# Altium schematic symbol library MCU_Microchip_ATmega.SchLib: 440 symbols (part 4 of 7) (continued)
## ATmega1284P-P (continued)
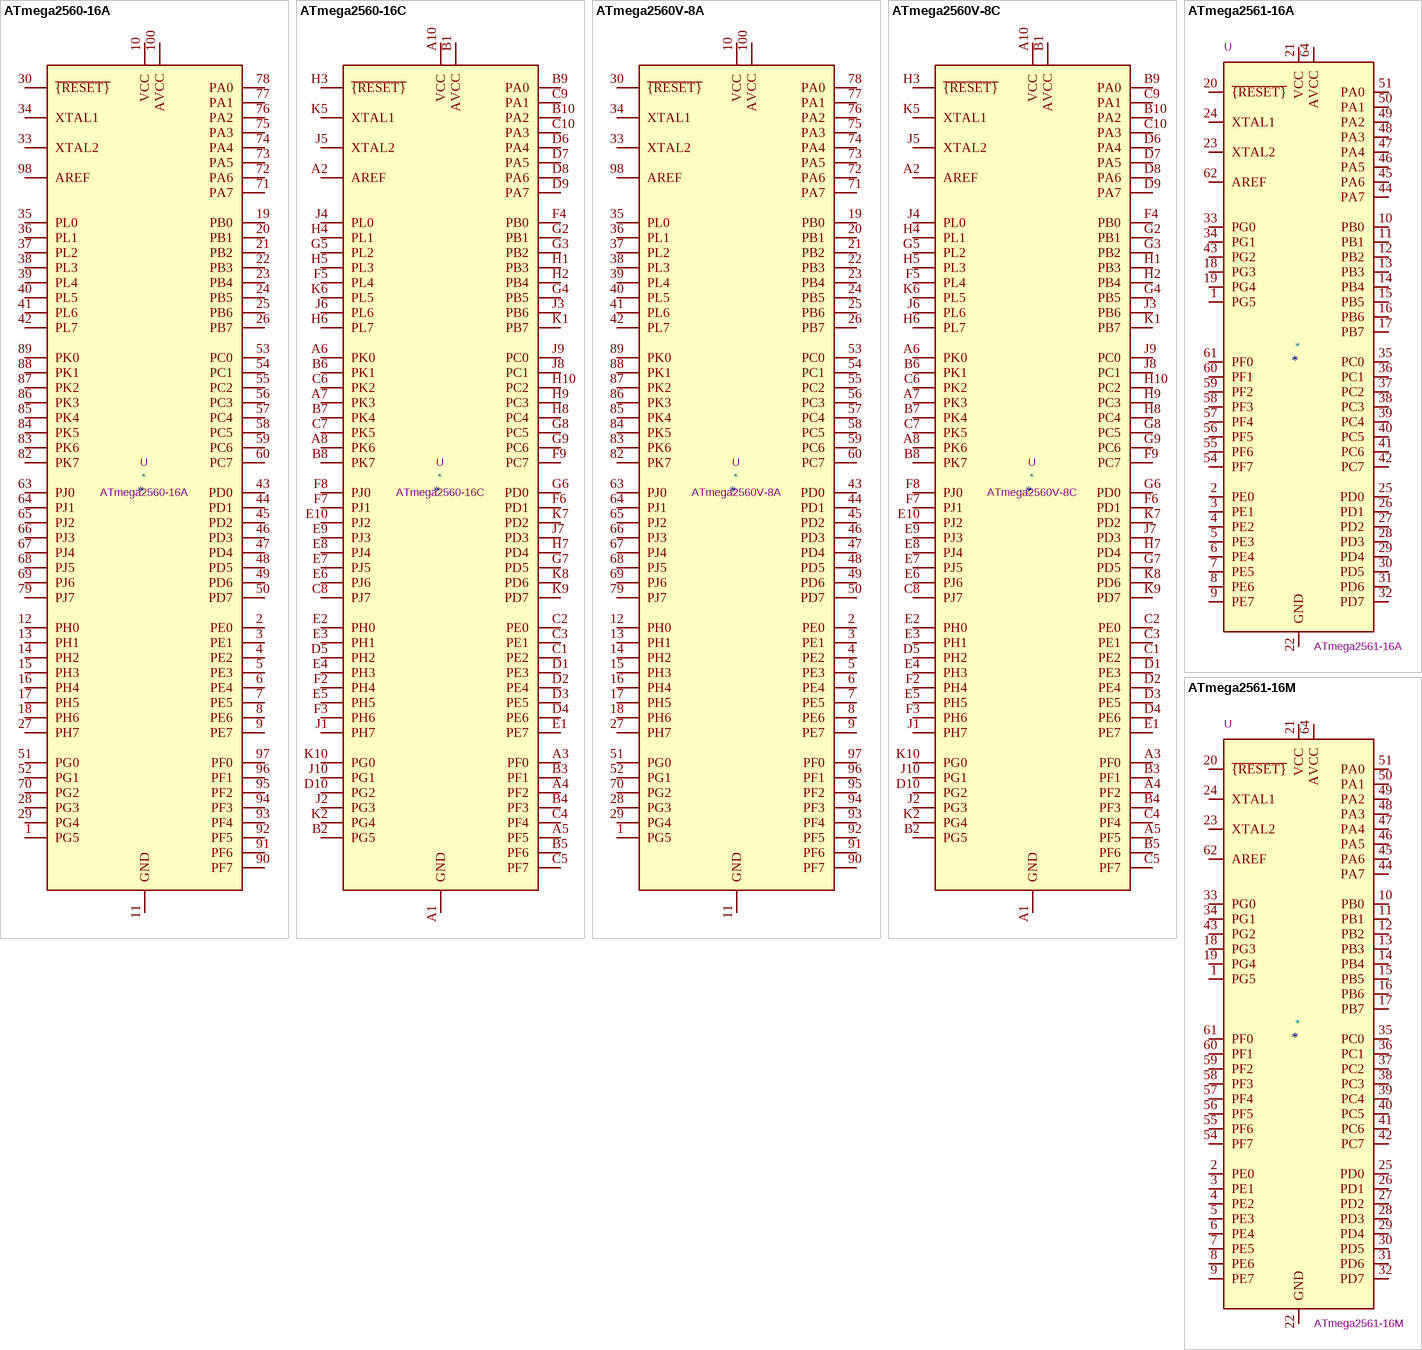
[diagram p24: symbols ATmega2560-16A to ATmega2561-16M]

## ATmega2560-16A
designator *  value ATmega2560-16A  Reference: U
ki_keywords: AVR 8bit Microcontroller MegaAVR; ki_description: 16MHz, 256kB Flash, 8kB SRAM, 4kB EEPROM, JTAG, TQFP-100; ki_fp_filters: TQFP*14x14mm*P0.5mm*; Footprint: Package_QFP:TQFP-100_14x14mm_P0.5mm; Datasheet: http://ww1.microchip.com/downloads/en/DeviceDoc/Atmel-2549-8-bit-AVR-Microcontroller-ATmega640-1280-1281-2560-2561_datasheet.pdf
pins: 1 PG5, 2 PE0, 3 PE1, 4 PE2, 5 PE3, 6 PE4, 7 PE5, 8 PE6, 9 PE7, 10 VCC, 11 GND, 12 PH0, 13 PH1, 14 PH2, 15 PH3, 16 PH4, 17 PH5, 18 PH6, 19 PB0, 20 PB1, 21 PB2, 22 PB3, 23 PB4, 24 PB5, 25 PB6, 26 PB7, 27 PH7, 28 PG3, 29 PG4, 30 ~{{RESET}}, 31 VCC hidden, 32 GND hidden, 33 XTAL2, 34 XTAL1, 35 PL0, 36 PL1, 37 PL2, 38 PL3, 39 PL4, 40 PL5, 41 PL6, 42 PL7, 43 PD0, 44 PD1, 45 PD2, 46 PD3, 47 PD4, 48 PD5, 49 PD6, 50 PD7, 51 PG0, 52 PG1, 53 PC0, 54 PC1, 55 PC2, 56 PC3, 57 PC4, 58 PC5, 59 PC6, 60 PC7, 61 VCC hidden, 62 GND hidden, 63 PJ0, 64 PJ1, 65 PJ2, 66 PJ3, 67 PJ4, 68 PJ5, 69 PJ6, 70 PG2, 71 PA7, 72 PA6, 73 PA5, 74 PA4, 75 PA3, 76 PA2, 77 PA1, 78 PA0, 79 PJ7, 80 VCC hidden, 81 GND hidden, 82 PK7, 83 PK6, 84 PK5, 85 PK4, 86 PK3, 87 PK2, 88 PK1, 89 PK0, 90 PF7, 91 PF6, 92 PF5, 93 PF4, 94 PF3, 95 PF2, 96 PF1, 97 PF0, 98 AREF, 99 GND hidden, 100 AVCC

## ATmega2560-16C
designator *  value ATmega2560-16C  Reference: U
ki_keywords: AVR 8bit Microcontroller MegaAVR; ki_description: 16MHz, 256kB Flash, 8kB SRAM, 4kB EEPROM, JTAG, TFBGA-100; ki_fp_filters: TFBGA*9.0x9.0mm*Layout10x10*P0.8mm*; Footprint: Package_BGA:TFBGA-100_9.0x9.0mm_Layout10x10_P0.8mm; Datasheet: http://ww1.microchip.com/downloads/en/DeviceDoc/Atmel-2549-8-bit-AVR-Microcontroller-ATmega640-1280-1281-2560-2561_datasheet.pdf
pins: A1 GND, A2 AREF, A3 PF0, A4 PF2, A5 PF5, A6 PK0, A7 PK3, A8 PK6, A9 GND hidden, A10 VCC, B1 AVCC, B2 PG5, B3 PF1, B4 PF3, B5 PF6, B6 PK1, B7 PK4, B8 PK7, B9 PA0, B10 PA2, C1 PE2, C2 PE0, C3 PE1, C4 PF4, C5 PF7, C6 PK2, C7 PK5, C8 PJ7, C9 PA1, C10 PA3, D1 PE3, D2 PE4, D3 PE5, D4 PE6, D5 PH2, D6 PA4, D7 PA5, D8 PA6, D9 PA7, D10 PG2, E1 PE7, E2 PH0, E3 PH1, E4 PH3, E5 PH5, E6 PJ6, E7 PJ5, E8 PJ4, E9 PJ3, E10 PJ2, F1 VCC hidden, F2 PH4, F3 PH6, F4 PB0, F5 PL4, F6 PD1, F7 PJ1, F8 PJ0, F9 PC7, F10 GND hidden, G1 GND hidden, G2 PB1, G3 PB2, G4 PB5, G5 PL2, G6 PD0, G7 PD5, G8 PC5, G9 PC6, G10 VCC hidden, H1 PB3, H2 PB4, H3 ~{{RESET}}, H4 PL1, H5 PL3, H6 PL7, H7 PD4, H8 PC4, H9 PC3, H10 PC2, J1 PH7, J2 PG3, J3 PB6, J4 PL0, J5 XTAL2, J6 PL6, J7 PD3, J8 PC1, J9 PC0, J10 PG1, K1 PB7, K2 PG4, K3 VCC hidden, K4 GND hidden, K5 XTAL1, K6 PL5, K7 PD2, K8 PD6, K9 PD7, K10 PG0

## ATmega2560V-8A
designator *  value ATmega2560V-8A  Reference: U
ki_keywords: AVR 8bit Microcontroller MegaAVR; ki_description: 8MHz, 256kB Flash, 8kB SRAM, 4kB EEPROM, JTAG, TQFP-100; ki_fp_filters: TQFP*14x14mm*P0.5mm*; Footprint: Package_QFP:TQFP-100_14x14mm_P0.5mm; Datasheet: http://ww1.microchip.com/downloads/en/DeviceDoc/Atmel-2549-8-bit-AVR-Microcontroller-ATmega640-1280-1281-2560-2561_datasheet.pdf
pins: 1 PG5, 2 PE0, 3 PE1, 4 PE2, 5 PE3, 6 PE4, 7 PE5, 8 PE6, 9 PE7, 10 VCC, 11 GND, 12 PH0, 13 PH1, 14 PH2, 15 PH3, 16 PH4, 17 PH5, 18 PH6, 19 PB0, 20 PB1, 21 PB2, 22 PB3, 23 PB4, 24 PB5, 25 PB6, 26 PB7, 27 PH7, 28 PG3, 29 PG4, 30 ~{{RESET}}, 31 VCC hidden, 32 GND hidden, 33 XTAL2, 34 XTAL1, 35 PL0, 36 PL1, 37 PL2, 38 PL3, 39 PL4, 40 PL5, 41 PL6, 42 PL7, 43 PD0, 44 PD1, 45 PD2, 46 PD3, 47 PD4, 48 PD5, 49 PD6, 50 PD7, 51 PG0, 52 PG1, 53 PC0, 54 PC1, 55 PC2, 56 PC3, 57 PC4, 58 PC5, 59 PC6, 60 PC7, 61 VCC hidden, 62 GND hidden, 63 PJ0, 64 PJ1, 65 PJ2, 66 PJ3, 67 PJ4, 68 PJ5, 69 PJ6, 70 PG2, 71 PA7, 72 PA6, 73 PA5, 74 PA4, 75 PA3, 76 PA2, 77 PA1, 78 PA0, 79 PJ7, 80 VCC hidden, 81 GND hidden, 82 PK7, 83 PK6, 84 PK5, 85 PK4, 86 PK3, 87 PK2, 88 PK1, 89 PK0, 90 PF7, 91 PF6, 92 PF5, 93 PF4, 94 PF3, 95 PF2, 96 PF1, 97 PF0, 98 AREF, 99 GND hidden, 100 AVCC

## ATmega2560V-8C
designator *  value ATmega2560V-8C  Reference: U
ki_keywords: AVR 8bit Microcontroller MegaAVR; ki_description: 8MHz, 256kB Flash, 8kB SRAM, 4kB EEPROM, JTAG, TFBGA-100; ki_fp_filters: TFBGA*9.0x9.0mm*Layout10x10*P0.8mm*; Footprint: Package_BGA:TFBGA-100_9.0x9.0mm_Layout10x10_P0.8mm; Datasheet: http://ww1.microchip.com/downloads/en/DeviceDoc/Atmel-2549-8-bit-AVR-Microcontroller-ATmega640-1280-1281-2560-2561_datasheet.pdf
pins: A1 GND, A2 AREF, A3 PF0, A4 PF2, A5 PF5, A6 PK0, A7 PK3, A8 PK6, A9 GND hidden, A10 VCC, B1 AVCC, B2 PG5, B3 PF1, B4 PF3, B5 PF6, B6 PK1, B7 PK4, B8 PK7, B9 PA0, B10 PA2, C1 PE2, C2 PE0, C3 PE1, C4 PF4, C5 PF7, C6 PK2, C7 PK5, C8 PJ7, C9 PA1, C10 PA3, D1 PE3, D2 PE4, D3 PE5, D4 PE6, D5 PH2, D6 PA4, D7 PA5, D8 PA6, D9 PA7, D10 PG2, E1 PE7, E2 PH0, E3 PH1, E4 PH3, E5 PH5, E6 PJ6, E7 PJ5, E8 PJ4, E9 PJ3, E10 PJ2, F1 VCC hidden, F2 PH4, F3 PH6, F4 PB0, F5 PL4, F6 PD1, F7 PJ1, F8 PJ0, F9 PC7, F10 GND hidden, G1 GND hidden, G2 PB1, G3 PB2, G4 PB5, G5 PL2, G6 PD0, G7 PD5, G8 PC5, G9 PC6, G10 VCC hidden, H1 PB3, H2 PB4, H3 ~{{RESET}}, H4 PL1, H5 PL3, H6 PL7, H7 PD4, H8 PC4, H9 PC3, H10 PC2, J1 PH7, J2 PG3, J3 PB6, J4 PL0, J5 XTAL2, J6 PL6, J7 PD3, J8 PC1, J9 PC0, J10 PG1, K1 PB7, K2 PG4, K3 VCC hidden, K4 GND hidden, K5 XTAL1, K6 PL5, K7 PD2, K8 PD6, K9 PD7, K10 PG0

## ATmega2561-16A
designator *  value ATmega2561-16A  Reference: U
ki_keywords: AVR 8bit Microcontroller MegaAVR; ki_description: 16MHz, 256kB Flash, 8kB SRAM, 4kB EEPROM, JTAG, TQFP-64; ki_fp_filters: TQFP*14x14mm*P0.8mm*; Footprint: Package_QFP:TQFP-64_14x14mm_P0.8mm; Datasheet: http://ww1.microchip.com/downloads/en/DeviceDoc/Atmel-2549-8-bit-AVR-Microcontroller-ATmega640-1280-1281-2560-2561_datasheet.pdf
pins: 1 PG5, 2 PE0, 3 PE1, 4 PE2, 5 PE3, 6 PE4, 7 PE5, 8 PE6, 9 PE7, 10 PB0, 11 PB1, 12 PB2, 13 PB3, 14 PB4, 15 PB5, 16 PB6, 17 PB7, 18 PG3, 19 PG4, 20 ~{{RESET}}, 21 VCC, 22 GND, 23 XTAL2, 24 XTAL1, 25 PD0, 26 PD1, 27 PD2, 28 PD3, 29 PD4, 30 PD5, 31 PD6, 32 PD7, 33 PG0, 34 PG1, 35 PC0, 36 PC1, 37 PC2, 38 PC3, 39 PC4, 40 PC5, 41 PC6, 42 PC7, 43 PG2, 44 PA7, 45 PA6, 46 PA5, 47 PA4, 48 PA3, 49 PA2, 50 PA1, 51 PA0, 52 VCC hidden, 53 GND hidden, 54 PF7, 55 PF6, 56 PF5, 57 PF4, 58 PF3, 59 PF2, 60 PF1, 61 PF0, 62 AREF, 63 GND hidden, 64 AVCC

## ATmega2561-16M
designator *  value ATmega2561-16M  Reference: U
ki_keywords: AVR 8bit Microcontroller MegaAVR; ki_description: 16MHz, 256kB Flash, 8kB SRAM, 4kB EEPROM, JTAG, QFN-64; ki_fp_filters: QFN*1EP*9x9mm*P0.5mm*; Footprint: Package_DFN_QFN:QFN-64-1EP_9x9mm_P0.5mm_EP7.65x7.65mm; Datasheet: http://ww1.microchip.com/downloads/en/DeviceDoc/Atmel-2549-8-bit-AVR-Microcontroller-ATmega640-1280-1281-2560-2561_datasheet.pdf
pins: 1 PG5, 2 PE0, 3 PE1, 4 PE2, 5 PE3, 6 PE4, 7 PE5, 8 PE6, 9 PE7, 10 PB0, 11 PB1, 12 PB2, 13 PB3, 14 PB4, 15 PB5, 16 PB6, 17 PB7, 18 PG3, 19 PG4, 20 ~{{RESET}}, 21 VCC, 22 GND, 23 XTAL2, 24 XTAL1, 25 PD0, 26 PD1, 27 PD2, 28 PD3, 29 PD4, 30 PD5, 31 PD6, 32 PD7, 33 PG0, 34 PG1, 35 PC0, 36 PC1, 37 PC2, 38 PC3, 39 PC4, 40 PC5, 41 PC6, 42 PC7, 43 PG2, 44 PA7, 45 PA6, 46 PA5, 47 PA4, 48 PA3, 49 PA2, 50 PA1, 51 PA0, 52 VCC hidden, 53 GND hidden, 54 PF7, 55 PF6, 56 PF5, 57 PF4, 58 PF3, 59 PF2, 60 PF1, 61 PF0, 62 AREF, 63 GND hidden, 64 AVCC, 65 GND hidden

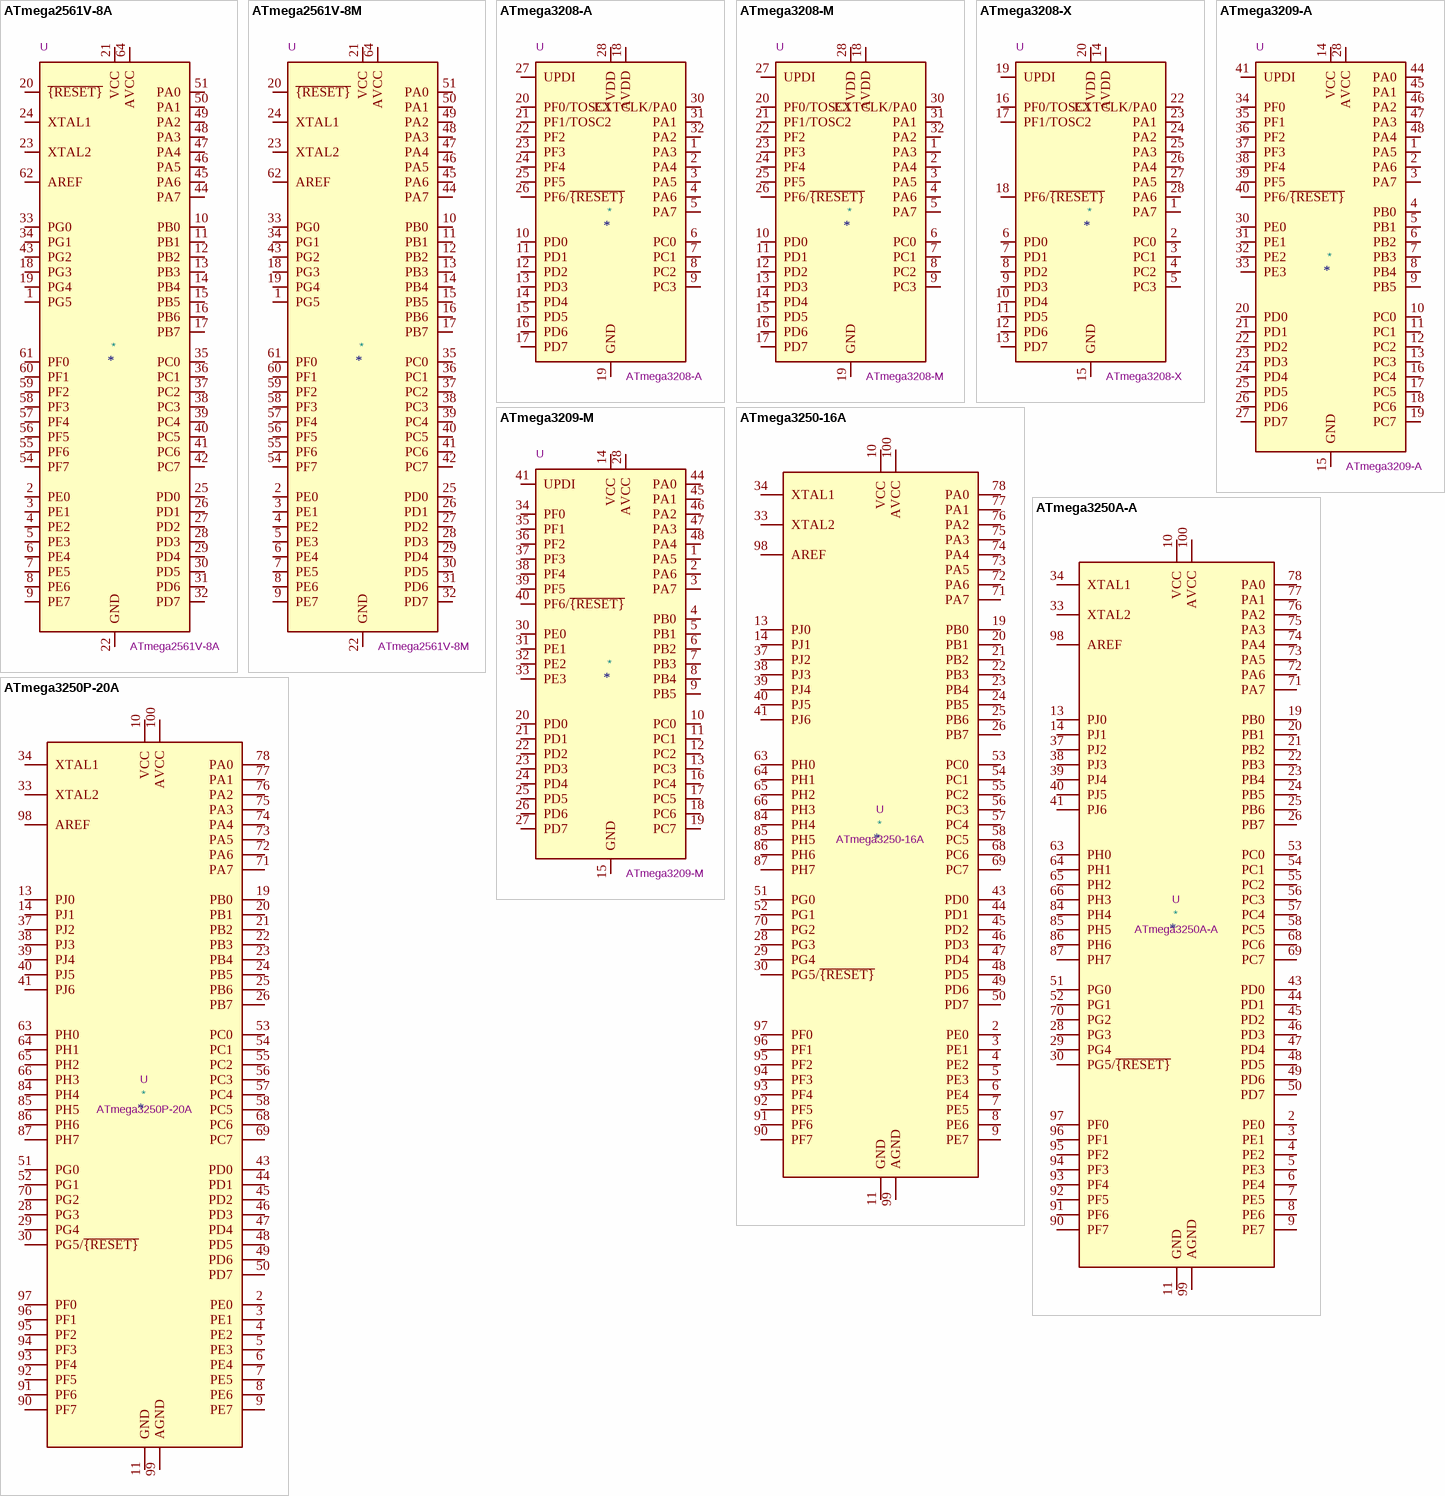
[diagram p25: symbols ATmega2561V-8A to ATmega3250P-20A]

## ATmega2561V-8A
designator *  value ATmega2561V-8A  Reference: U
ki_keywords: AVR 8bit Microcontroller MegaAVR; ki_description: 8MHz, 256kB Flash, 8kB SRAM, 4kB EEPROM, JTAG, TQFP-64; ki_fp_filters: TQFP*14x14mm*P0.8mm*; Footprint: Package_QFP:TQFP-64_14x14mm_P0.8mm; Datasheet: http://ww1.microchip.com/downloads/en/DeviceDoc/Atmel-2549-8-bit-AVR-Microcontroller-ATmega640-1280-1281-2560-2561_datasheet.pdf
pins: 1 PG5, 2 PE0, 3 PE1, 4 PE2, 5 PE3, 6 PE4, 7 PE5, 8 PE6, 9 PE7, 10 PB0, 11 PB1, 12 PB2, 13 PB3, 14 PB4, 15 PB5, 16 PB6, 17 PB7, 18 PG3, 19 PG4, 20 ~{{RESET}}, 21 VCC, 22 GND, 23 XTAL2, 24 XTAL1, 25 PD0, 26 PD1, 27 PD2, 28 PD3, 29 PD4, 30 PD5, 31 PD6, 32 PD7, 33 PG0, 34 PG1, 35 PC0, 36 PC1, 37 PC2, 38 PC3, 39 PC4, 40 PC5, 41 PC6, 42 PC7, 43 PG2, 44 PA7, 45 PA6, 46 PA5, 47 PA4, 48 PA3, 49 PA2, 50 PA1, 51 PA0, 52 VCC hidden, 53 GND hidden, 54 PF7, 55 PF6, 56 PF5, 57 PF4, 58 PF3, 59 PF2, 60 PF1, 61 PF0, 62 AREF, 63 GND hidden, 64 AVCC

## ATmega2561V-8M
designator *  value ATmega2561V-8M  Reference: U
ki_keywords: AVR 8bit Microcontroller MegaAVR; ki_description: 8MHz, 256kB Flash, 8kB SRAM, 4kB EEPROM, JTAG, QFN-64; ki_fp_filters: QFN*1EP*9x9mm*P0.5mm*; Footprint: Package_DFN_QFN:QFN-64-1EP_9x9mm_P0.5mm_EP7.65x7.65mm; Datasheet: http://ww1.microchip.com/downloads/en/DeviceDoc/Atmel-2549-8-bit-AVR-Microcontroller-ATmega640-1280-1281-2560-2561_datasheet.pdf
pins: 1 PG5, 2 PE0, 3 PE1, 4 PE2, 5 PE3, 6 PE4, 7 PE5, 8 PE6, 9 PE7, 10 PB0, 11 PB1, 12 PB2, 13 PB3, 14 PB4, 15 PB5, 16 PB6, 17 PB7, 18 PG3, 19 PG4, 20 ~{{RESET}}, 21 VCC, 22 GND, 23 XTAL2, 24 XTAL1, 25 PD0, 26 PD1, 27 PD2, 28 PD3, 29 PD4, 30 PD5, 31 PD6, 32 PD7, 33 PG0, 34 PG1, 35 PC0, 36 PC1, 37 PC2, 38 PC3, 39 PC4, 40 PC5, 41 PC6, 42 PC7, 43 PG2, 44 PA7, 45 PA6, 46 PA5, 47 PA4, 48 PA3, 49 PA2, 50 PA1, 51 PA0, 52 VCC hidden, 53 GND hidden, 54 PF7, 55 PF6, 56 PF5, 57 PF4, 58 PF3, 59 PF2, 60 PF1, 61 PF0, 62 AREF, 63 GND hidden, 64 AVCC, 65 GND hidden

## ATmega3208-A
designator *  value ATmega3208-A  Reference: U
ki_keywords: AVR 8bit Microcontroller MegaAVR; ki_description: 20MHz, 32kB Flash, 4kB SRAM, 256B EEPROM, TQFP-32; ki_fp_filters: TQFP*7x7mm*P0.8mm*; Footprint: Package_QFP:TQFP-32_7x7mm_P0.8mm; Datasheet: http://ww1.microchip.com/downloads/en/DeviceDoc/40002017A.pdf
pins: 1 PA3, 2 PA4, 3 PA5, 4 PA6, 5 PA7, 6 PC0, 7 PC1, 8 PC2, 9 PC3, 10 PD0, 11 PD1, 12 PD2, 13 PD3, 14 PD4, 15 PD5, 16 PD6, 17 PD7, 18 AVDD, 19 GND, 20 PF0/TOSC1, 21 PF1/TOSC2, 22 PF2, 23 PF3, 24 PF4, 25 PF5, 26 PF6/~{{RESET}}, 27 UPDI, 28 VDD, 29 GND hidden, 30 EXTCLK/PA0, 31 PA1, 32 PA2

## ATmega3208-M
designator *  value ATmega3208-M  Reference: U
ki_keywords: AVR 8bit Microcontroller MegaAVR; ki_description: 20MHz, 32kB Flash, 4kB SRAM, 256B EEPROM, VQFN-32; ki_fp_filters: QFN*1EP*5x5mm*P0.5mm*; Footprint: Package_DFN_QFN:QFN-32-1EP_5x5mm_P0.5mm_EP3.1x3.1mm_ThermalVias; Datasheet: http://ww1.microchip.com/downloads/en/DeviceDoc/40002017A.pdf
pins: 1 PA3, 2 PA4, 3 PA5, 4 PA6, 5 PA7, 6 PC0, 7 PC1, 8 PC2, 9 PC3, 10 PD0, 11 PD1, 12 PD2, 13 PD3, 14 PD4, 15 PD5, 16 PD6, 17 PD7, 18 AVDD, 19 GND, 20 PF0/TOSC1, 21 PF1/TOSC2, 22 PF2, 23 PF3, 24 PF4, 25 PF5, 26 PF6/~{{RESET}}, 27 UPDI, 28 VDD, 29 GND hidden, 30 EXTCLK/PA0, 31 PA1, 32 PA2, 33 GND hidden

## ATmega3208-X
designator *  value ATmega3208-X  Reference: U
ki_keywords: AVR 8bit Microcontroller MegaAVR; ki_description: 20MHz, 32kB Flash, 4kB SRAM, 256B EEPROM, SSOP-28; ki_fp_filters: SSOP*5.3x10.2mm*P0.65mm*; Footprint: Package_SO:SSOP-28_5.3x10.2mm_P0.65mm; Datasheet: http://ww1.microchip.com/downloads/en/DeviceDoc/40002018A.pdf
pins: 1 PA7, 2 PC0, 3 PC1, 4 PC2, 5 PC3, 6 PD0, 7 PD1, 8 PD2, 9 PD3, 10 PD4, 11 PD5, 12 PD6, 13 PD7, 14 AVDD, 15 GND, 16 PF0/TOSC1, 17 PF1/TOSC2, 18 PF6/~{{RESET}}, 19 UPDI, 20 VDD, 21 GND hidden, 22 EXTCLK/PA0, 23 PA1, 24 PA2, 25 PA3, 26 PA4, 27 PA5, 28 PA6

## ATmega3209-A
designator *  value ATmega3209-A  Reference: U
ki_keywords: AVR 8bit Microcontroller MegaAVR; ki_description: 20MHz, 32kB Flash, 4kB SRAM, 256B EEPROM, TQFP-48; ki_fp_filters: TQFP*7x7mm*P0.5mm*; Footprint: Package_QFP:TQFP-48_7x7mm_P0.5mm; Datasheet: http://ww1.microchip.com/downloads/en/DeviceDoc/40002016A.pdf
pins: 1 PA5, 2 PA6, 3 PA7, 4 PB0, 5 PB1, 6 PB2, 7 PB3, 8 PB4, 9 PB5, 10 PC0, 11 PC1, 12 PC2, 13 PC3, 14 VCC, 15 GND, 16 PC4, 17 PC5, 18 PC6, 19 PC7, 20 PD0, 21 PD1, 22 PD2, 23 PD3, 24 PD4, 25 PD5, 26 PD6, 27 PD7, 28 AVCC, 29 GND hidden, 30 PE0, 31 PE1, 32 PE2, 33 PE3, 34 PF0, 35 PF1, 36 PF2, 37 PF3, 38 PF4, 39 PF5, 40 PF6/~{{RESET}}, 41 UPDI, 42 VCC hidden, 43 GND hidden, 44 PA0, 45 PA1, 46 PA2, 47 PA3, 48 PA4

## ATmega3209-M
designator *  value ATmega3209-M  Reference: U
ki_keywords: AVR 8bit Microcontroller MegaAVR; ki_description: 20MHz, 32kB Flash, 4kB SRAM, 256B EEPROM, UQFN-48; ki_fp_filters: UQFN*1EP*6x6mm*P0.4mm*; Footprint: Package_DFN_QFN:UQFN-48-1EP_6x6mm_P0.4mm_EP4.62x4.62mm; Datasheet: http://ww1.microchip.com/downloads/en/DeviceDoc/40002016A.pdf
pins: 1 PA5, 2 PA6, 3 PA7, 4 PB0, 5 PB1, 6 PB2, 7 PB3, 8 PB4, 9 PB5, 10 PC0, 11 PC1, 12 PC2, 13 PC3, 14 VCC, 15 GND, 16 PC4, 17 PC5, 18 PC6, 19 PC7, 20 PD0, 21 PD1, 22 PD2, 23 PD3, 24 PD4, 25 PD5, 26 PD6, 27 PD7, 28 AVCC, 29 GND hidden, 30 PE0, 31 PE1, 32 PE2, 33 PE3, 34 PF0, 35 PF1, 36 PF2, 37 PF3, 38 PF4, 39 PF5, 40 PF6/~{{RESET}}, 41 UPDI, 42 VCC hidden, 43 GND hidden, 44 PA0, 45 PA1, 46 PA2, 47 PA3, 48 PA4, 49 GND hidden

## ATmega3250-16A
designator *  value ATmega3250-16A  Reference: U
ki_keywords: AVR 8bit Microcontroller MegaAVR; ki_description: 16MHz, 32kB Flash, 2kB SRAM, 1kB EEPROM, JTAG, TQFP-100; ki_fp_filters: TQFP*14x14mm*P0.5mm*; Footprint: Package_QFP:TQFP-100_14x14mm_P0.5mm; Datasheet: http://ww1.microchip.com/downloads/en/DeviceDoc/doc2570.pdf
pins: 1 NC hidden, 2 PE0, 3 PE1, 4 PE2, 5 PE3, 6 PE4, 7 PE5, 8 PE6, 9 PE7, 10 VCC, 11 GND, 12 NC hidden, 13 PJ0, 14 PJ1, 15 NC hidden, 16 NC hidden, 17 NC hidden, 18 NC hidden, 19 PB0, 20 PB1, 21 PB2, 22 PB3, 23 PB4, 24 PB5, 25 PB6, 26 PB7, 27 NC hidden, 28 PG3, 29 PG4, 30 PG5/~{{RESET}}, 31 VCC hidden, 32 GND hidden, 33 XTAL2, 34 XTAL1, 35 NC hidden, 36 NC hidden, 37 PJ2, 38 PJ3, 39 PJ4, 40 PJ5, 41 PJ6, 42 NC hidden, 43 PD0, 44 PD1, 45 PD2, 46 PD3, 47 PD4, 48 PD5, 49 PD6, 50 PD7, 51 PG0, 52 PG1, 53 PC0, 54 PC1, 55 PC2, 56 PC3, 57 PC4, 58 PC5, 59 NC hidden, 60 NC hidden, 61 NC hidden, 62 NC hidden, 63 PH0, 64 PH1, 65 PH2, 66 PH3, 67 NC hidden, 68 PC6, 69 PC7, 70 PG2, 71 PA7, 72 PA6, 73 PA5, 74 PA4, 75 PA3, 76 PA2, 77 PA1, 78 PA0, 79 NC hidden, 80 VCC hidden, 81 GND hidden, 82 NC hidden, 83 NC hidden, 84 PH4, 85 PH5, 86 PH6, 87 PH7, 88 NC hidden, 89 NC hidden, 90 PF7, 91 PF6, 92 PF5, 93 PF4, 94 PF3, 95 PF2, 96 PF1, 97 PF0, 98 AREF, 99 AGND, 100 AVCC

## ATmega3250A-A
designator *  value ATmega3250A-A  Reference: U
ki_keywords: AVR 8bit Microcontroller MegaAVR; ki_description: 20MHz, 32kB Flash, 2kB SRAM, 1kB EEPROM, JTAG, TQFP-100; ki_fp_filters: TQFP*14x14mm*P0.5mm*; Footprint: Package_QFP:TQFP-100_14x14mm_P0.5mm; Datasheet: http://ww1.microchip.com/downloads/en/DeviceDoc/atmel-8285-8-bit-avr-microcontroller-atmega165a_pa_325a_pa_3250a_pa_645a_p_6450a_p_datasheet.pdf
pins: 1 NC hidden, 2 PE0, 3 PE1, 4 PE2, 5 PE3, 6 PE4, 7 PE5, 8 PE6, 9 PE7, 10 VCC, 11 GND, 12 NC hidden, 13 PJ0, 14 PJ1, 15 NC hidden, 16 NC hidden, 17 NC hidden, 18 NC hidden, 19 PB0, 20 PB1, 21 PB2, 22 PB3, 23 PB4, 24 PB5, 25 PB6, 26 PB7, 27 NC hidden, 28 PG3, 29 PG4, 30 PG5/~{{RESET}}, 31 VCC hidden, 32 GND hidden, 33 XTAL2, 34 XTAL1, 35 NC hidden, 36 NC hidden, 37 PJ2, 38 PJ3, 39 PJ4, 40 PJ5, 41 PJ6, 42 NC hidden, 43 PD0, 44 PD1, 45 PD2, 46 PD3, 47 PD4, 48 PD5, 49 PD6, 50 PD7, 51 PG0, 52 PG1, 53 PC0, 54 PC1, 55 PC2, 56 PC3, 57 PC4, 58 PC5, 59 NC hidden, 60 NC hidden, 61 NC hidden, 62 NC hidden, 63 PH0, 64 PH1, 65 PH2, 66 PH3, 67 NC hidden, 68 PC6, 69 PC7, 70 PG2, 71 PA7, 72 PA6, 73 PA5, 74 PA4, 75 PA3, 76 PA2, 77 PA1, 78 PA0, 79 NC hidden, 80 VCC hidden, 81 GND hidden, 82 NC hidden, 83 NC hidden, 84 PH4, 85 PH5, 86 PH6, 87 PH7, 88 NC hidden, 89 NC hidden, 90 PF7, 91 PF6, 92 PF5, 93 PF4, 94 PF3, 95 PF2, 96 PF1, 97 PF0, 98 AREF, 99 AGND, 100 AVCC

## ATmega3250P-20A
designator *  value ATmega3250P-20A  Reference: U
ki_keywords: AVR 8bit Microcontroller MegaAVR; ki_description: 20MHz, 32kB Flash, 2kB SRAM, 1kB EEPROM, JTAG, TQFP-100; ki_fp_filters: TQFP*14x14mm*P0.5mm*; Footprint: Package_QFP:TQFP-100_14x14mm_P0.5mm; Datasheet: http://ww1.microchip.com/downloads/en/DeviceDoc/doc8023.pdf
pins: 1 NC hidden, 2 PE0, 3 PE1, 4 PE2, 5 PE3, 6 PE4, 7 PE5, 8 PE6, 9 PE7, 10 VCC, 11 GND, 12 NC hidden, 13 PJ0, 14 PJ1, 15 NC hidden, 16 NC hidden, 17 NC hidden, 18 NC hidden, 19 PB0, 20 PB1, 21 PB2, 22 PB3, 23 PB4, 24 PB5, 25 PB6, 26 PB7, 27 NC hidden, 28 PG3, 29 PG4, 30 PG5/~{{RESET}}, 31 VCC hidden, 32 GND hidden, 33 XTAL2, 34 XTAL1, 35 NC hidden, 36 NC hidden, 37 PJ2, 38 PJ3, 39 PJ4, 40 PJ5, 41 PJ6, 42 NC hidden, 43 PD0, 44 PD1, 45 PD2, 46 PD3, 47 PD4, 48 PD5, 49 PD6, 50 PD7, 51 PG0, 52 PG1, 53 PC0, 54 PC1, 55 PC2, 56 PC3, 57 PC4, 58 PC5, 59 NC hidden, 60 NC hidden, 61 NC hidden, 62 NC hidden, 63 PH0, 64 PH1, 65 PH2, 66 PH3, 67 NC hidden, 68 PC6, 69 PC7, 70 PG2, 71 PA7, 72 PA6, 73 PA5, 74 PA4, 75 PA3, 76 PA2, 77 PA1, 78 PA0, 79 NC hidden, 80 VCC hidden, 81 GND hidden, 82 NC hidden, 83 NC hidden, 84 PH4, 85 PH5, 86 PH6, 87 PH7, 88 NC hidden, 89 NC hidden, 90 PF7, 91 PF6, 92 PF5, 93 PF4, 94 PF3, 95 PF2, 96 PF1, 97 PF0, 98 AREF, 99 AGND, 100 AVCC

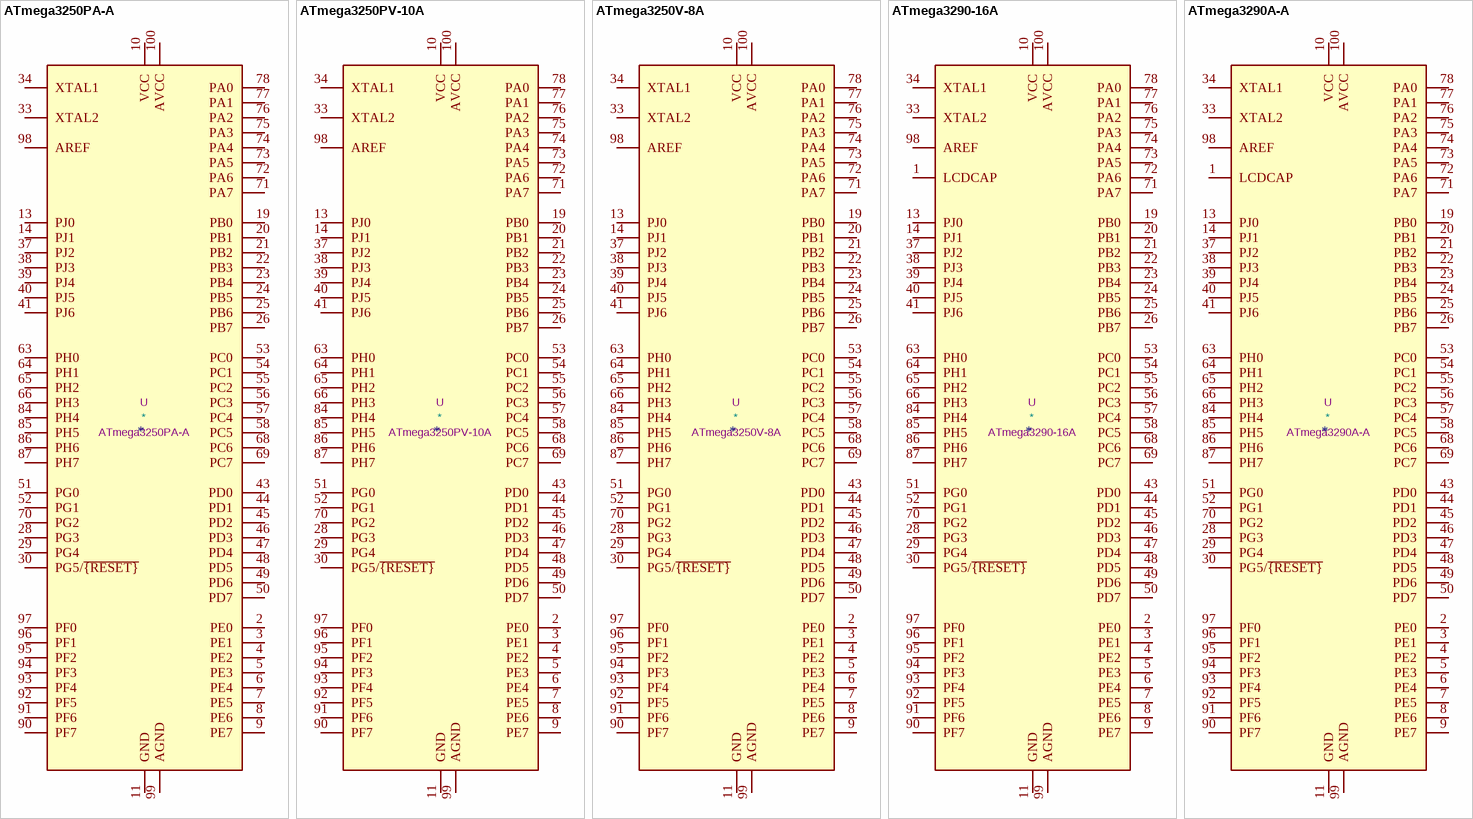
[diagram p26: symbols ATmega3250PA-A to ATmega3290A-A]

## ATmega3250PA-A
designator *  value ATmega3250PA-A  Reference: U
ki_keywords: AVR 8bit Microcontroller MegaAVR; ki_description: 20MHz, 32kB Flash, 2kB SRAM, 1kB EEPROM, JTAG, TQFP-100; ki_fp_filters: TQFP*14x14mm*P0.5mm*; Footprint: Package_QFP:TQFP-100_14x14mm_P0.5mm; Datasheet: http://ww1.microchip.com/downloads/en/DeviceDoc/atmel-8285-8-bit-avr-microcontroller-atmega165a_pa_325a_pa_3250a_pa_645a_p_6450a_p_datasheet.pdf
pins: 1 NC hidden, 2 PE0, 3 PE1, 4 PE2, 5 PE3, 6 PE4, 7 PE5, 8 PE6, 9 PE7, 10 VCC, 11 GND, 12 NC hidden, 13 PJ0, 14 PJ1, 15 NC hidden, 16 NC hidden, 17 NC hidden, 18 NC hidden, 19 PB0, 20 PB1, 21 PB2, 22 PB3, 23 PB4, 24 PB5, 25 PB6, 26 PB7, 27 NC hidden, 28 PG3, 29 PG4, 30 PG5/~{{RESET}}, 31 VCC hidden, 32 GND hidden, 33 XTAL2, 34 XTAL1, 35 NC hidden, 36 NC hidden, 37 PJ2, 38 PJ3, 39 PJ4, 40 PJ5, 41 PJ6, 42 NC hidden, 43 PD0, 44 PD1, 45 PD2, 46 PD3, 47 PD4, 48 PD5, 49 PD6, 50 PD7, 51 PG0, 52 PG1, 53 PC0, 54 PC1, 55 PC2, 56 PC3, 57 PC4, 58 PC5, 59 NC hidden, 60 NC hidden, 61 NC hidden, 62 NC hidden, 63 PH0, 64 PH1, 65 PH2, 66 PH3, 67 NC hidden, 68 PC6, 69 PC7, 70 PG2, 71 PA7, 72 PA6, 73 PA5, 74 PA4, 75 PA3, 76 PA2, 77 PA1, 78 PA0, 79 NC hidden, 80 VCC hidden, 81 GND hidden, 82 NC hidden, 83 NC hidden, 84 PH4, 85 PH5, 86 PH6, 87 PH7, 88 NC hidden, 89 NC hidden, 90 PF7, 91 PF6, 92 PF5, 93 PF4, 94 PF3, 95 PF2, 96 PF1, 97 PF0, 98 AREF, 99 AGND, 100 AVCC

## ATmega3250PV-10A
designator *  value ATmega3250PV-10A  Reference: U
ki_keywords: AVR 8bit Microcontroller MegaAVR; ki_description: 10MHz, 32kB Flash, 2kB SRAM, 1kB EEPROM, JTAG, TQFP-100; ki_fp_filters: TQFP*14x14mm*P0.5mm*; Footprint: Package_QFP:TQFP-100_14x14mm_P0.5mm; Datasheet: http://ww1.microchip.com/downloads/en/DeviceDoc/doc8023.pdf
pins: 1 NC hidden, 2 PE0, 3 PE1, 4 PE2, 5 PE3, 6 PE4, 7 PE5, 8 PE6, 9 PE7, 10 VCC, 11 GND, 12 NC hidden, 13 PJ0, 14 PJ1, 15 NC hidden, 16 NC hidden, 17 NC hidden, 18 NC hidden, 19 PB0, 20 PB1, 21 PB2, 22 PB3, 23 PB4, 24 PB5, 25 PB6, 26 PB7, 27 NC hidden, 28 PG3, 29 PG4, 30 PG5/~{{RESET}}, 31 VCC hidden, 32 GND hidden, 33 XTAL2, 34 XTAL1, 35 NC hidden, 36 NC hidden, 37 PJ2, 38 PJ3, 39 PJ4, 40 PJ5, 41 PJ6, 42 NC hidden, 43 PD0, 44 PD1, 45 PD2, 46 PD3, 47 PD4, 48 PD5, 49 PD6, 50 PD7, 51 PG0, 52 PG1, 53 PC0, 54 PC1, 55 PC2, 56 PC3, 57 PC4, 58 PC5, 59 NC hidden, 60 NC hidden, 61 NC hidden, 62 NC hidden, 63 PH0, 64 PH1, 65 PH2, 66 PH3, 67 NC hidden, 68 PC6, 69 PC7, 70 PG2, 71 PA7, 72 PA6, 73 PA5, 74 PA4, 75 PA3, 76 PA2, 77 PA1, 78 PA0, 79 NC hidden, 80 VCC hidden, 81 GND hidden, 82 NC hidden, 83 NC hidden, 84 PH4, 85 PH5, 86 PH6, 87 PH7, 88 NC hidden, 89 NC hidden, 90 PF7, 91 PF6, 92 PF5, 93 PF4, 94 PF3, 95 PF2, 96 PF1, 97 PF0, 98 AREF, 99 AGND, 100 AVCC

## ATmega3250V-8A
designator *  value ATmega3250V-8A  Reference: U
ki_keywords: AVR 8bit Microcontroller MegaAVR; ki_description: 8MHz, 32kB Flash, 2kB SRAM, 1kB EEPROM, JTAG, TQFP-100; ki_fp_filters: TQFP*14x14mm*P0.5mm*; Footprint: Package_QFP:TQFP-100_14x14mm_P0.5mm; Datasheet: http://ww1.microchip.com/downloads/en/DeviceDoc/doc2570.pdf
pins: 1 NC hidden, 2 PE0, 3 PE1, 4 PE2, 5 PE3, 6 PE4, 7 PE5, 8 PE6, 9 PE7, 10 VCC, 11 GND, 12 NC hidden, 13 PJ0, 14 PJ1, 15 NC hidden, 16 NC hidden, 17 NC hidden, 18 NC hidden, 19 PB0, 20 PB1, 21 PB2, 22 PB3, 23 PB4, 24 PB5, 25 PB6, 26 PB7, 27 NC hidden, 28 PG3, 29 PG4, 30 PG5/~{{RESET}}, 31 VCC hidden, 32 GND hidden, 33 XTAL2, 34 XTAL1, 35 NC hidden, 36 NC hidden, 37 PJ2, 38 PJ3, 39 PJ4, 40 PJ5, 41 PJ6, 42 NC hidden, 43 PD0, 44 PD1, 45 PD2, 46 PD3, 47 PD4, 48 PD5, 49 PD6, 50 PD7, 51 PG0, 52 PG1, 53 PC0, 54 PC1, 55 PC2, 56 PC3, 57 PC4, 58 PC5, 59 NC hidden, 60 NC hidden, 61 NC hidden, 62 NC hidden, 63 PH0, 64 PH1, 65 PH2, 66 PH3, 67 NC hidden, 68 PC6, 69 PC7, 70 PG2, 71 PA7, 72 PA6, 73 PA5, 74 PA4, 75 PA3, 76 PA2, 77 PA1, 78 PA0, 79 NC hidden, 80 VCC hidden, 81 GND hidden, 82 NC hidden, 83 NC hidden, 84 PH4, 85 PH5, 86 PH6, 87 PH7, 88 NC hidden, 89 NC hidden, 90 PF7, 91 PF6, 92 PF5, 93 PF4, 94 PF3, 95 PF2, 96 PF1, 97 PF0, 98 AREF, 99 AGND, 100 AVCC

## ATmega3290-16A
designator *  value ATmega3290-16A  Reference: U
ki_keywords: AVR 8bit Microcontroller MegaAVR; ki_description: 16MHz, 32kB Flash, 2kB SRAM, 1kB EEPROM, JTAG, TQFP-100; ki_fp_filters: TQFP*14x14mm*P0.5mm*; Footprint: Package_QFP:TQFP-100_14x14mm_P0.5mm; Datasheet: http://ww1.microchip.com/downloads/en/DeviceDoc/doc2552.pdf
pins: 1 LCDCAP, 2 PE0, 3 PE1, 4 PE2, 5 PE3, 6 PE4, 7 PE5, 8 PE6, 9 PE7, 10 VCC, 11 GND, 12 NC hidden, 13 PJ0, 14 PJ1, 15 NC hidden, 16 NC hidden, 17 NC hidden, 18 NC hidden, 19 PB0, 20 PB1, 21 PB2, 22 PB3, 23 PB4, 24 PB5, 25 PB6, 26 PB7, 27 NC hidden, 28 PG3, 29 PG4, 30 PG5/~{{RESET}}, 31 VCC hidden, 32 GND hidden, 33 XTAL2, 34 XTAL1, 35 NC hidden, 36 NC hidden, 37 PJ2, 38 PJ3, 39 PJ4, 40 PJ5, 41 PJ6, 42 NC hidden, 43 PD0, 44 PD1, 45 PD2, 46 PD3, 47 PD4, 48 PD5, 49 PD6, 50 PD7, 51 PG0, 52 PG1, 53 PC0, 54 PC1, 55 PC2, 56 PC3, 57 PC4, 58 PC5, 59 NC hidden, 60 NC hidden, 61 NC hidden, 62 NC hidden, 63 PH0, 64 PH1, 65 PH2, 66 PH3, 67 NC hidden, 68 PC6, 69 PC7, 70 PG2, 71 PA7, 72 PA6, 73 PA5, 74 PA4, 75 PA3, 76 PA2, 77 PA1, 78 PA0, 79 NC hidden, 80 VCC hidden, 81 GND hidden, 82 NC hidden, 83 NC hidden, 84 PH4, 85 PH5, 86 PH6, 87 PH7, 88 NC hidden, 89 NC hidden, 90 PF7, 91 PF6, 92 PF5, 93 PF4, 94 PF3, 95 PF2, 96 PF1, 97 PF0, 98 AREF, 99 AGND, 100 AVCC